# Altium footprint library SparkFun.PCBLIB: 674 footprints (part 32 of 44)
Each footprint in its own frame and in the unit in brackets; x right, y up, seen from the top. Pads: shape width x height; smd on the part's side, far side on the other; paste and mask are expansions set on the pad; w line width, h text height; cw(c..) or ccw(c..) is an arc to the next point about the centre after c.
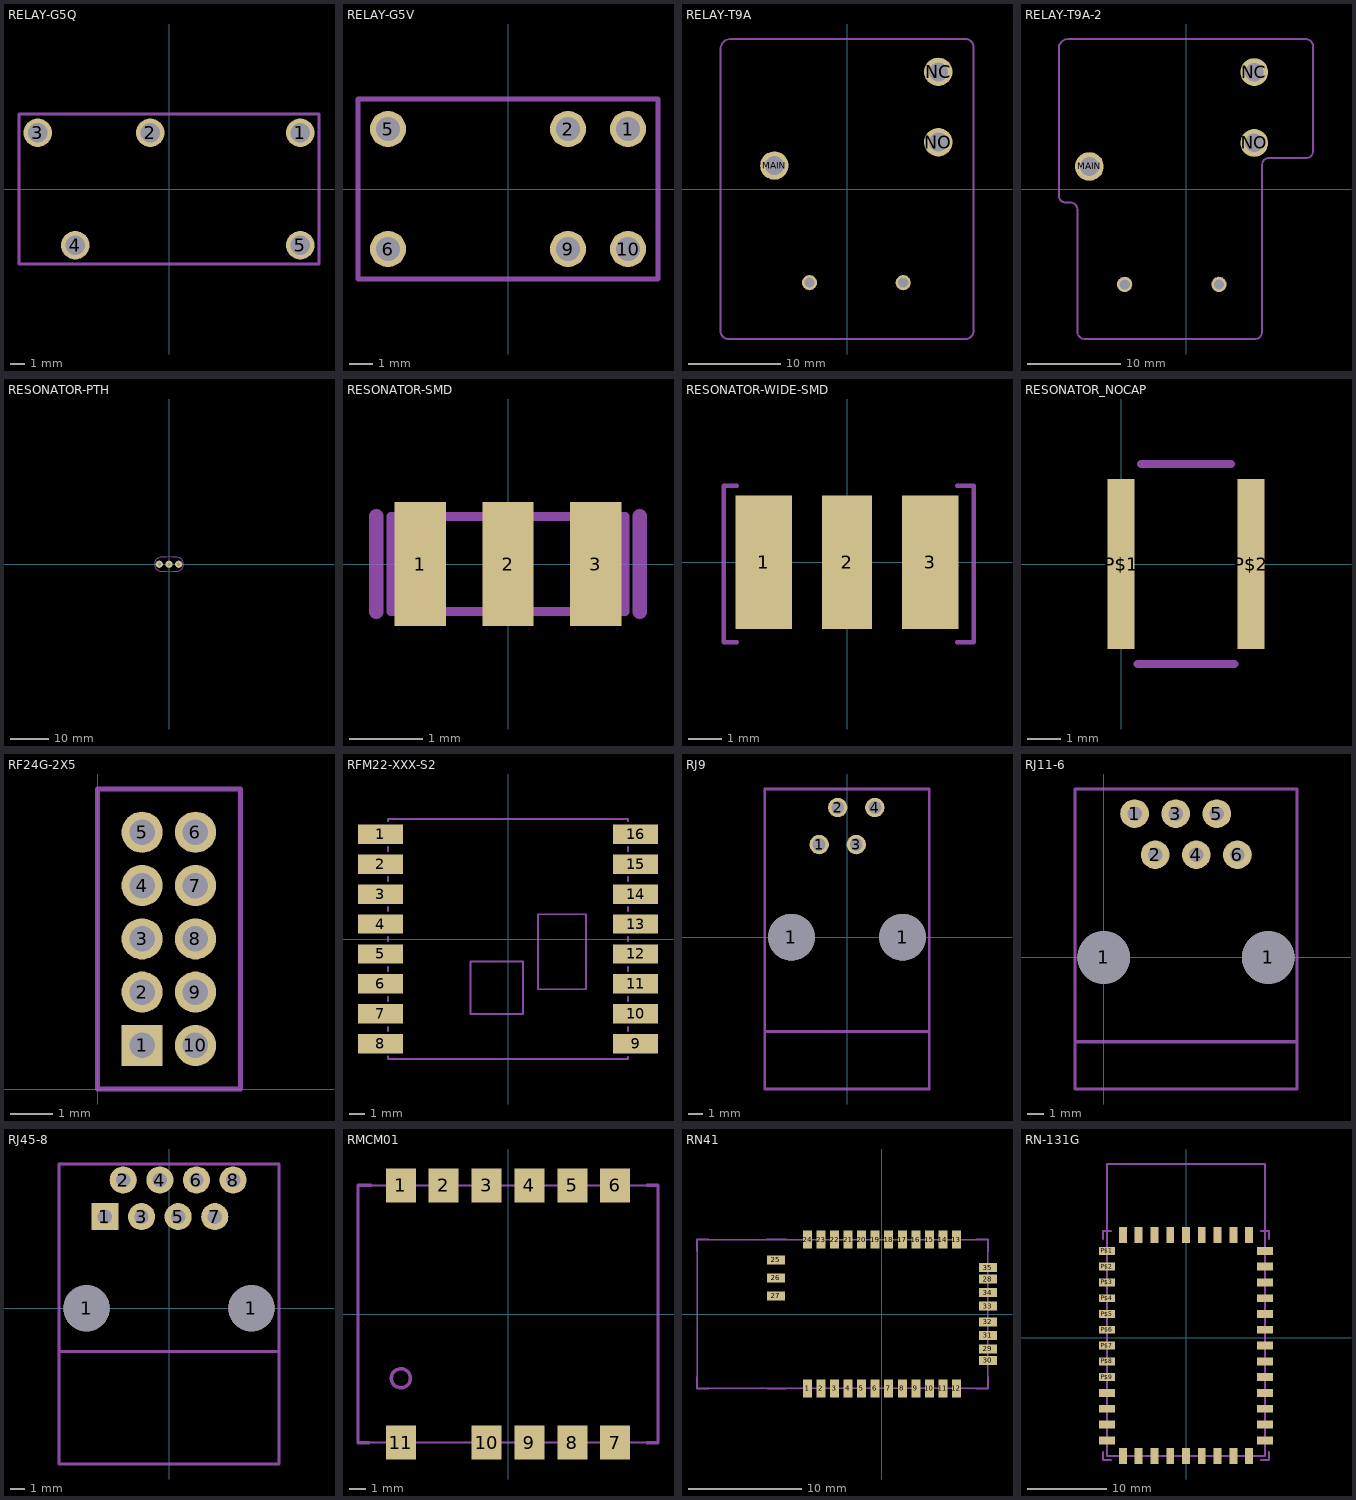
[diagram p31: the footprints below, top view; thin cyan lines are the x and y axes]

## RELAY-G5Q [mil]
pads (5):
  round 76.77 hole 51.18: 1(350,150) 2(-50,150) 3(-350,150) 4(-250,-150) 5(350,-150)
Mechanical 2:
  lines w8: -400,-200 400,-200 400,200 -400,200 -400,-200

## RELAY-G5V [mil]
pads (6):
  round 60 hole 40: 1(200,100) 2(100,100) 5(-200,100) 6(-200,-100) 9(100,-100) 10(200,-100)
Mechanical 2:
  lines w8: -250,-150 250,-150 250,150 -250,150 -250,-150

## RELAY-T9A [mil]
pads (5):
  round 64.5 hole 43: COIL1(-160,-400) COIL2(240,-400)
  round 121.5 hole 81: MAIN(-310,100) NC(390,500) NO(390,200)
Mechanical 2:
  lines w8: -540,-600 -540,600 cw(c-497.5,597.5) -500,640 500,640 cw(c505,605) 540,600 540,-600 cw(c505,-605) 500,-640 -500,-640 cw(c-505,-605) -540,-600

## RELAY-T9A-2 [mm]
pads (5):
  round 1.65 hole 1.1: COIL1(-6.61,-10.27) COIL2(3.55,-10.27)
  round 3.086 hole 2.057: MAIN(-10.41,2.43)
  round 3 hole 2: NC(7.35,12.6) NO(7.35,4.97)
Mechanical 2:
  lines w0.203: -13.7,-0.7 -13.7,15.24 cw(c-12.688,15.133) -12.7,16.15 12.7,16.15 cw(c12.859,15.32) 13.7,15.24 13.7,4.1 cw(c12.928,4.119) 13,3.35 8.9,3.35 ccw(c8.972,2.581) 8.2,2.6 8.2,-15.4 cw(c7.428,-15.381) 7.5,-16.15 -11,-16.15 cw(c-10.917,-15.358) -11.7,-15.5 -11.7,-2.2 ccw(c-12.472,-2.219) -12.4,-1.45 -13,-1.45 cw(c-12.984,-0.734) -13.7,-0.7

## RESONATOR-PTH [mil]
pads (3):
  round 74 hole 31.5: 1(-100,0) 2(0,0) 3(100,0)
Mechanical 2:
  lines w8: -90,-70 cw(c-79.17,0) -90,70 cw(c0,-735) 90,70 cw(c79.17,0) 90,-70 cw(c0,737.5) -90,-70

## RESONATOR-SMD [mil]
pads (3):
  rect 27.56x66.93 smd: 1(-47.24,0) 2(0,0) 3(47.24,0)
Mechanical 2:
  lines w8: -70.87,-25.59 -70.87,25.59 ; 70.87,-25.59 70.87,25.59
Mechanical 18:
  lines w5: -62.99,-25.59 62.99,-25.59 62.99,25.59 -62.99,25.59 -62.99,-25.59

## RESONATOR-WIDE-SMD [mm]
pads (3):
  rect 1.7x4 smd: 1(-2.5,0) 3(2.5,0)
  rect 1.5x4 smd: 2(0,0)
Mech48:
  lines w0.127: -3.3,-2.4 -3.7,-2.4 -3.7,2.3 -3.3,2.3 ; 3.3,-2.4 3.8,-2.4 3.8,2.3 3.3,2.3

## RESONATOR_NOCAP [mil]
pads (2):
  rect 31.5x200.79 smd: P$1(0,0) P$2(153.54,0)
Mechanical 2:
  lines w10: 19.69,-118.11 133.86,-118.11 ; 23.62,118.11 129.92,118.11

## RF24G-2X5 [mil]
pads (10):
  rect 38x38 hole 23.62: 1(41.21,40.21)
  round 38 hole 23.62: 2(41.21,89.43) 3(41.21,138.64) 4(41.21,187.85) 5(41.21,237.06) 6(90.43,237.06) 7(90.43,187.85) 8(90.43,138.64) 9(90.43,89.43) 10(90.43,40.21)
Mechanical 18:
  lines w5: 0,0 132,0 132,277 0,277 0,0

## RFM22-XXX-S2 [mm]
pads (16):
  rect 3x1.3 smd: 1(-8.5,7) 2(-8.5,5) 3(-8.5,3) 4(-8.5,1) 5(-8.5,-1) 6(-8.5,-3) 7(-8.5,-5) 8(-8.5,-7) 9(8.5,-7) 10(8.5,-5) 11(8.5,-3) 12(8.5,-1) 13(8.5,1) 14(8.5,3) 15(8.5,5) 16(8.5,7)
Mechanical 2:
  lines w0.127: -8,-8 8,-8 ; -8,-7.981 -8,-7.83 ; -8,-6.15 -8,-5.85 ; -8,-4.15 -8,-3.85 ; -8,-2.15 -8,-1.85 ; -8,-0.15 -8,0.15 ; -8,1.85 -8,2.15 ; -8,3.85 -8,4.15 ; -8,5.85 -8,6.15 ; -8,7.849 -8,8 8,8 8,7.849 ; 8,-8.002 8,-7.85 ; 8,-6.15 8,-5.85 ; 8,-4.15 8,-3.85 ; 8,-2.15 8,-1.85 ; 8,-0.15 8,0.15 ; 8,1.85 8,2.15 ; 8,3.85 8,4.15 ; 8,5.85 8,6.15 ; -2.5,-5 1,-5 1,-1.5 -2.5,-1.5 -2.5,-5 ; 2,-3.35 2,1.65 5.2,1.65 5.2,-3.35 2,-3.35
Mechanical 18:
  lines w0.127: -2.5,-5 1,-5 1,-1.5 -2.5,-1.5 -2.5,-5 ; 2,-3.35 5.2,-3.35 5.2,1.65 2,1.65 2,-3.35

## RJ9 [mil]
pads (6):
  round 125.98 hole 125.98: 1(-150,0) 1(150,0)
  round 52.5 hole 35: 1(-75,250) 2(-25,350) 3(25,250) 4(75,350)
Mechanical 2:
  lines w8: -222.05,-255 -222.05,400 222.05,400 222.05,-255 -222.05,-255
Mechanical 18:
  lines w8: -222.05,-255 -222.05,-409.84 222.05,-409.84 222.05,-255

## RJ11-6 [mil]
pads (8):
  round 128 hole 128: 1(0,0) 1(400,0)
  round 70 hole 35: 1(75,350) 2(125,250) 3(175,350) 4(225,250) 5(275,350) 6(325,250)
Mechanical 2:
  lines w8: -70,-205 -70,410 470,410 470,-205 -70,-205
Mechanical 18:
  lines w8: -70,-205 -70,-320 470,-320 470,-205

## RJ45-8 [mil]
pads (10):
  round 125.98 hole 125.98: 1(-225,0) 1(225,0)
  rect 74x74 hole 39.37: 1(-175,250)
  round 74 hole 39.37: 2(-125,350) 3(-75,250) 4(-25,350) 5(25,250) 6(75,350) 7(125,250) 8(175,350)
Mechanical 2:
  lines w8: -300,-118.11 -300,393.7 300,393.7 300,-118.11 -300,-118.11
Mechanical 18:
  lines w8: -300,-118.11 -300,-425.2 300,-425.2 300,-118.11

## RMCM01 [mil]
pads (11):
  rect 70x80 smd: 1(-250,300) 2(-150,300) 3(-50,300) 4(50,300) 5(150,300) 6(250,300) 7(250,-300) 8(150,-300) 9(50,-300) 10(-50,-300) 11(-250,-300)
Mechanical 2:
  circle w8: c-250,-150 r22.36
  lines w8: -325,-300 -350,-300 -350,300 -320,300 ; 325,-300 350,-300 350,300 325,300
Mechanical 18:
  lines w5: -350,-300 -350,300 350,300 350,-300 -350,-300

## RN41 [mil]
pads (35):
  rect 31.5x62.99 smd: 1(-259.84,-259.84) 2(-212.6,-259.84) 3(-165.35,-259.84) 4(-118.11,-259.84) 5(-70.87,-259.84) 6(-23.62,-259.84) 7(23.62,-259.84) 8(70.87,-259.84) 9(118.11,-259.84) 10(165.35,-259.84) 11(212.6,-259.84) 12(259.84,-259.84) 13(259.84,259.84) 14(212.6,259.84) 15(165.35,259.84) 16(118.11,259.84) 17(70.87,259.84) 18(23.62,259.84) 19(-23.62,259.84) 20(-70.87,259.84) 21(-118.11,259.84) 22(-165.35,259.84) 23(-212.6,259.84) 24(-259.84,259.84)
  rect 62.99x31.5 smd: 25(-370.08,188.98) 26(-370.08,125.98) 27(-370.08,62.99) 28(370.08,122.05) 29(370.08,-122.05) 30(370.08,-162.29) 31(370.08,-74.8) 32(370.08,-27.56) 33(370.08,27.56) 34(370.08,74.8) 35(370.08,162.29)
Mechanical 2:
  lines w8: -645.67,-220.47 -645.67,-259.84 -606.3,-259.84 ; -645.67,220.47 -645.67,259.84 -606.3,259.84 ; -401.57,-259.84 -334.65,-259.84 ; -401.57,259.84 -334.65,259.84 ; 330.71,-259.84 370.08,-259.84 370.08,-220.47 ; 330.71,259.84 370.08,259.84 370.08,220.47
Mechanical 18:
  lines w5: -645.67,-259.84 -645.67,259.84 370.08,259.84 370.08,-259.84 -645.67,-259.84

## RN-131G [mm]
pads (44):
  rect 2x1 smd: P$1(-10,11) P$2(-10,9) P$3(-10,7) P$4(-10,5) P$5(-10,3) P$6(-10,1) P$7(-10,-1) P$8(-10,-3) P$9(-10,-5) P$10(-10,-7) P$11(-10,-9) P$12(-10,-11) P$13(-10,-13) P$23(10,-13) P$24(10,-11) P$25(10,-9) P$26(10,-7) P$27(10,-5) P$28(10,-3) P$29(10,-1) P$30(10,1) P$31(10,3) P$32(10,5) P$33(10,7) P$34(10,9) P$35(10,11)
  rect 1x2 smd: P$14(-8,-15) P$15(-6,-15) P$16(-4,-15) P$17(-2,-15) P$18(0,-15) P$19(2,-15) P$20(4,-15) P$21(6,-15) P$22(8,-15) P$36(8,13) P$37(6,13) P$38(4,13) P$39(2,13) P$40(0,13) P$41(-2,13) P$42(-4,13) P$43(-6,13) P$44(-8,13)
Mechanical 2:
  lines w0.254: -10.5,-14.5 -10.5,-15.5 -9.5,-15.5 ; -10.5,12.5 -10.5,13.5 -9.5,13.5 ; 9.5,-15.5 10.5,-15.5 10.5,-14.5 ; 9.5,13.5 10.5,13.5 10.5,12.5
Mechanical 18:
  lines w0.254: -10,-15 10,-15 10,22 -10,22 -10,-15